# Altium schematic symbol library My Library.SchLib: 1211 symbols (part 8 of 12)

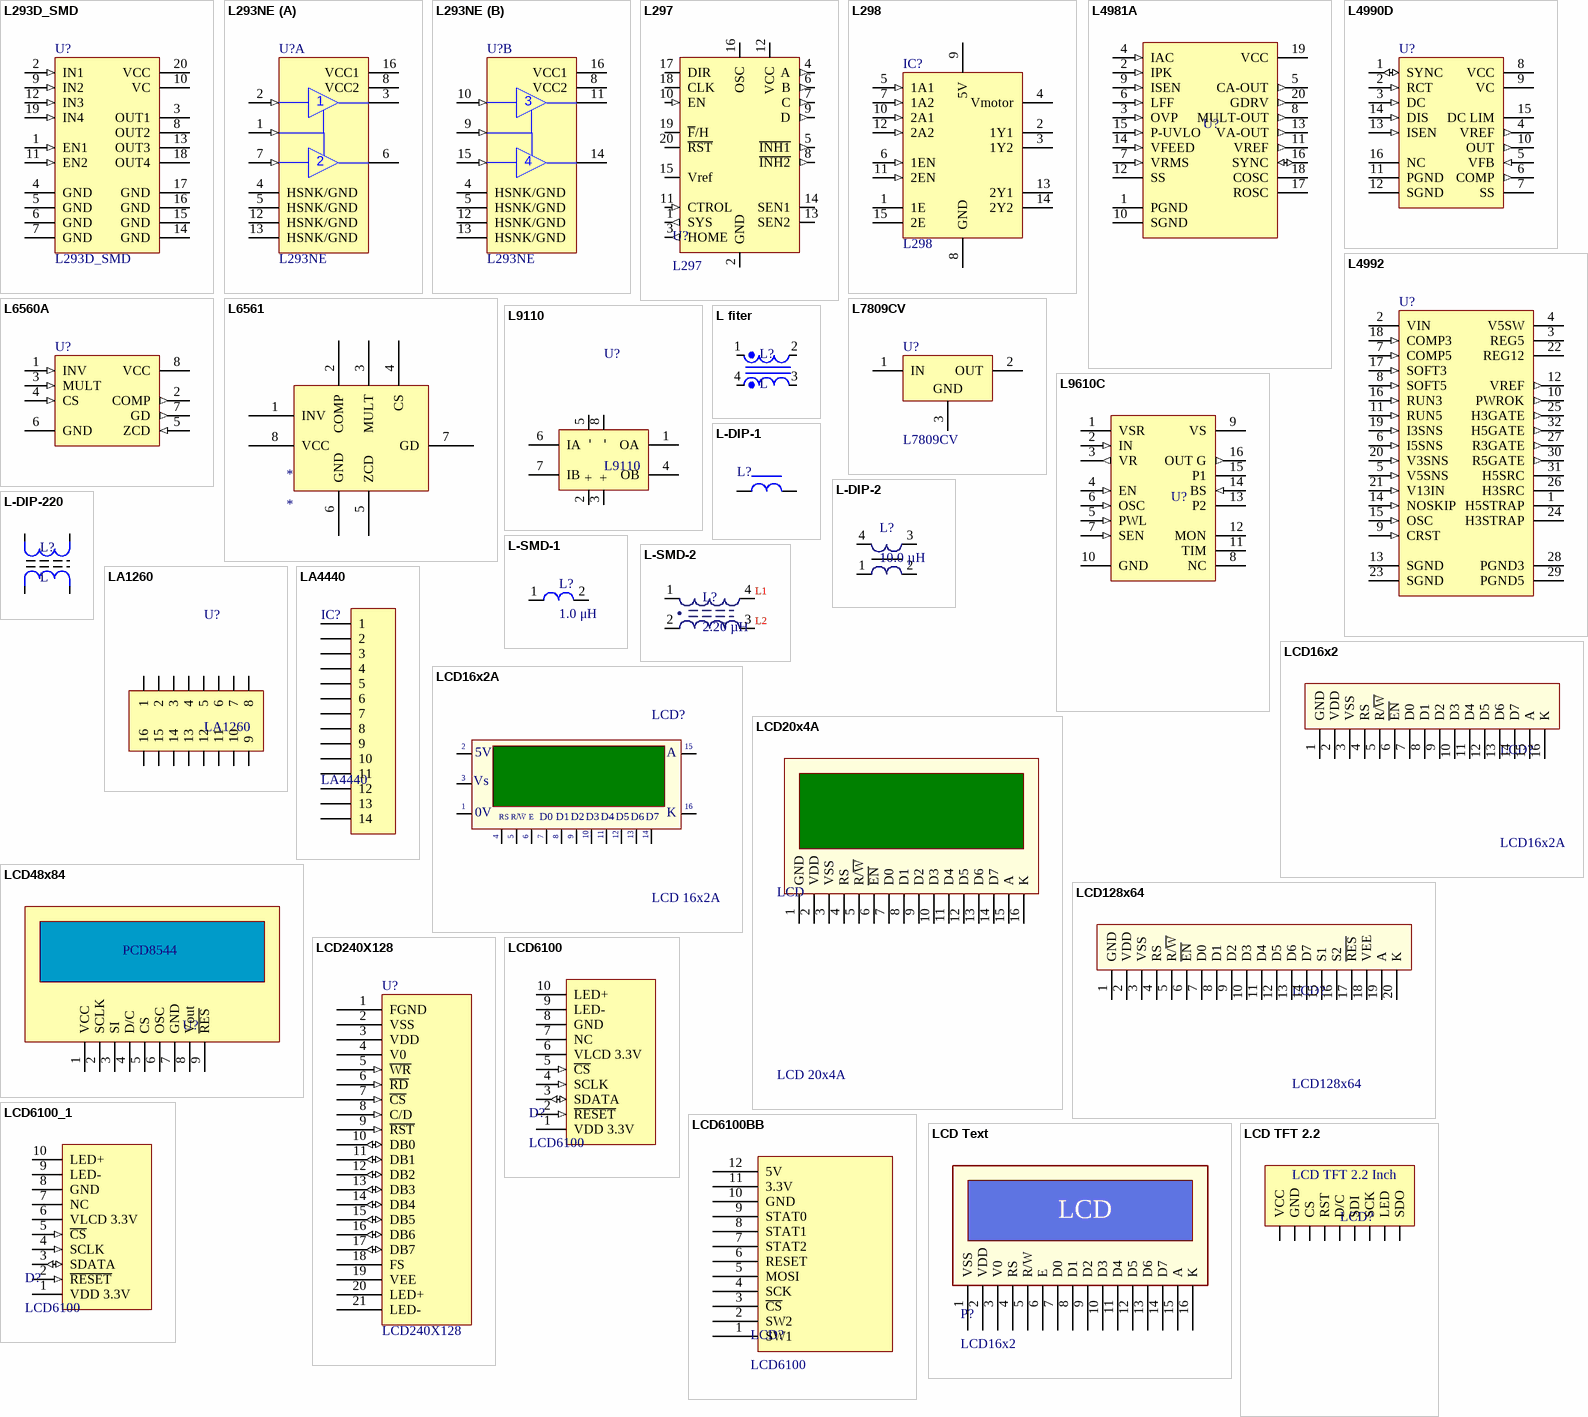
[diagram p48: symbols L293D_SMD to LCD TFT 2.2]

## L293D_SMD
designator U?
Push-Pull Four Channel Driver With Diode; Published: 8-Jun-2000; LatestRevisionDate: 06-Jun-2005; LatestRevisionNote: Stylized 3D Model Added.; DatasheetVersion: Jun-1996; PackageVersion: Apr-1996; PackageReference: DIP16; Publisher: Altium Limited; PackageDescription: DIP; 16 Leads; Row Spacing 7.62 mm; Pitch 2.54 mm; ComponentLink1Description: Manufacturer Link; ComponentLink1URL: http://www.st.com/; ComponentLink2Description: Datasheet; ComponentLink2URL: http://www.st.com/stonline/products/literature/ds/1330/l293d.pdf
footprint SO20 (SOIC, 20-Leads, Body 12.60x7.50mm, Pitch 1.27mm, IPC Medium Density)
pins: 1 EN1 (in), 2 IN1 (in), 3 OUT1 (hiz), 4 GND (power), 5 GND (power), 6 GND (power), 7 GND (power), 8 OUT2 (hiz), 9 IN2 (in), 10 VC (power), 11 EN2 (in), 12 IN3 (in), 13 OUT3 (hiz), 14 GND (power), 15 GND (power), 16 GND (power), 17 GND (power), 18 OUT4 (hiz), 19 IN4 (in), 20 VCC (power)

## L293NE
designator U?
Quadruple Half-H Driver; Published: 15-May-2002; LatestRevisionDate: 04-Mar-2005; LatestRevisionNote: Stylized 3D Model Added.; DatasheetVersion: May-1990; PackageVersion: 1991; PackageReference: NE016; Publisher: Altium Limited; PackageDescription: DIP; 16 Leads; Row Spacing 7.62 mm; Pitch 2.54 mm; Code_JEDEC: MS-001-BB; ComponentLink1Description: Manufacturer Link; ComponentLink1URL: http://www.ti.com/; ComponentLink2Description: Datasheet; ComponentLink2URL: http://www-s.ti.com/sc/ds/l293.pdf
footprint DIP16/W0.3 (16 PIN, W 300mil, Pin to pin 100mil)
pins on every part: 4 HSNK/GND (power), 5 HSNK/GND (power), 8 VCC2 (power), 12 HSNK/GND (power), 13 HSNK/GND (power), 16 VCC1 (power)
part A pins: 1 1,2EN (in), 2 1A (in), 3 1Y (hiz), 6 2Y (hiz), 7 2A (in)
part B pins: 9 3,4EN (in), 10 3A (in), 11 3Y (hiz), 14 4Y (hiz), 15 4A (in)

## L297
designator U?
Stepmotor control
footprint DIP20/W0.3 (DIP 20, 20 PIN, W 300mil, Pin to pin 100mil)
footprint SOP-20
pins: 1 SYS (out), 2 GND (power), 3 HOME (out), 4 A (out), 5 ~{INH1} (out), 6 B (out), 7 C (out), 8 ~{INH2} (out), 9 D (out), 10 EN (in), 11 CTROL (in), 12 VCC (power), 13 SEN2 (power), 14 SEN1 (power), 15 Vref (power), 16 OSC (power), 17 DIR (power), 18 CLK (power), 19 ~{F}/H (power), 20 ~{RST} (power)

## L298
designator IC?
Dual Full-H Driver; Note: The tab is elec is connected to GND pin; Published: 15-May-2002; DatasheetVersion: Jun-1990; PackageReference: KV015; Publisher: Altium Limited; PackageDescription: TO, Thru-Hole, Vertical, Heatsink Mounted; 15 Bent Staggered Leads; Pitch 1.27 mm; ComponentLink1Description: Manufacturer Link; ComponentLink1URL: http://www.ti.com/
footprint DIP15SL2 (TO, Thru-Hole, Vertical, Heatsink Mounted; 15 Bent Staggered Leads; Pitch 1.27 mm)
pins: 1 1E, 2 1Y1 (hiz), 3 1Y2 (hiz), 4 Vmotor (power), 5 1A1 (in), 6 1EN (in), 7 1A2 (in), 8 GND (power), 9 5V (power), 10 2A1 (in), 11 2EN (in), 12 2A2 (in), 13 2Y1 (hiz), 14 2Y2 (hiz), 15 2E

## L4981A
designator U?
Power Factor Corrector; Published: 24-Aug-2001; LatestRevisionDate: 06-Jun-2005; LatestRevisionNote: Stylized 3D Model Added.; DatasheetVersion: Sep-1998; PackageVersion: Jun-1998; PackageReference: DIP20; Publisher: Altium Limited; PackageDescription: DIP; 20 Leads; Row Spacing 7.62 mm; Pitch 2.54 mm; Code_JEDEC: MS-015-AE; ComponentLink1Description: Manufacturer Link; ComponentLink1URL: http://www.st.com/; ComponentLink2Description: Datasheet; ComponentLink2URL: http://www.st.com/stonline/products/literature/ds/1366/l4981.pdf
footprint DIP20 (DIP 20, 20 PIN, W 300mil, Pin to pin 100mil)
footprint SO20 (SOIC, 20-Leads, Body 12.60x7.50mm, Pitch 1.27mm, IPC Medium Density)
pins: 1 PGND (power), 2 IPK (in), 3 OVP (in), 4 IAC (in), 5 CA-OUT (out), 6 LFF (in), 7 VRMS (in), 8 MULT-OUT (out), 9 ISEN (in), 10 SGND (power), 11 VREF (out), 12 SS, 13 VA-OUT (out), 14 VFEED (in), 15 P-UVLO (in), 16 SYNC (io), 17 ROSC, 18 COSC, 19 VCC (power), 20 GDRV (out)

## L4990D
designator U?
Primary Controller; Published: 24-Aug-2001; LatestRevisionDate: 13-Apr-2006; LatestRevisionNote: IPC-7351 Footprint Added.; DatasheetVersion: Jul-1999; PackageVersion: Apr-1998; PackageReference: SO16W; Publisher: Altium Limited; PackageDescription: 16-Pin Small Outline Integrated Circuit 1.27 mm Pitch; Code_JEDEC: MS-013-AA; Code_IPC: SOIC127P1030-16; ComponentLink1Description: Manufacturer Link; ComponentLink1URL: http://www.st.com/
footprint DIP16
footprint SO16L (SOIC, 16-Leads, Body 10.30x7.50mm, Pitch 1.27mm, IPC Medium Density)
pins: 1 SYNC (io), 2 RCT (in), 3 DC (in), 4 VREF (out), 5 VFB (in), 6 COMP (out), 7 SS, 8 VCC (power), 9 VC (power), 10 OUT (out), 11 PGND (power), 12 SGND (power), 13 ISEN (in), 14 DIS (in), 15 DC LIM, 16 NC

## L4992
designator U?
Triple Output Power Supply Controller; Published: 24-Aug-2001; LatestRevisionDate: 13-Apr-2006; LatestRevisionNote: IPC-7351 Footprint Added.; DatasheetVersion: Mar-1998; PackageVersion: Oct-1997; PackageReference: TQFP32; Publisher: Altium Limited; PackageDescription: 32-Pin Thin Quad Flat Pack 0.8 mm Pitch; ComponentLink1Description: Manufacturer Link; ComponentLink1URL: http://www.st.com/
footprint TQFP32
pins: 1 H5STRAP, 2 VIN (power), 3 REG5 (power), 4 V5SW (power), 5 V5SNS (in), 6 I5SNS (in), 7 COMP5 (in), 8 SOFT5 (in), 9 CRST (in), 10 PWROK (out), 11 RUN5 (in), 12 VREF (out), 13 SGND (power), 14 NOSKIP (in), 15 OSC (in), 16 RUN3 (in), 17 SOFT3 (in), 18 COMP3 (in), 19 I3SNS (in), 20 V3SNS (in), 21 V13IN (in), 22 REG12 (power), 23 SGND (power), 24 H3STRAP, 25 H3GATE (out), 26 H3SRC, 27 R3GATE (out), 28 PGND3 (power), 29 PGND5 (power), 30 R5GATE (out), 31 H5SRC, 32 H5GATE (out)

## L6560A
designator U?
Power Factor Corrector; Published: 24-Aug-2001; LatestRevisionDate: 06-Jun-2005; LatestRevisionNote: Stylized 3D Model Added.; DatasheetVersion: Jul-1997; PackageReference: DIP8; Publisher: Altium Limited; PackageDescription: DIP; 8 Leads; Row Spacing 7.62 mm; Pitch 2.54 mm; Code_JEDEC: MO-001-AN; ComponentLink1Description: Manufacturer Link; ComponentLink1URL: http://www.st.com/
footprint DIP8
footprint SO8 (SOIC, 8-Leads, Body 4.9x3.9mm, Pitch 1.27mm, IPC High Density)
pins: 1 INV (in), 2 COMP (out), 3 MULT (in), 4 CS (in), 5 ZCD (in), 6 GND (power), 7 GD (out), 8 VCC (power)

## L6561
designator *
footprint DIP8
footprint SO8 (SOIC, 8-Leads, Body 4.9x3.9mm, Pitch 1.27mm, IPC High Density)
pins: 1 INV, 2 COMP, 3 MULT, 4 CS, 5 ZCD, 6 GND (power), 7 GD, 8 VCC (power)

## L7809CV
designator U?
Positive Voltage Regulator; Note: Tab is connected to pin 3 (GND).; Published: 24-Aug-2001; LatestRevisionDate: 17-Jul-2002; LatestRevisionNote: Re-released for DXP Platform.; DatasheetVersion: Dec-1998; PackageVersion: Jun-1998; PackageReference: TO220ABN; Publisher: Altium Limited; PackageDescription: TO, Thru-Hole, Vertical, Heatsink Mounted; 3 In-Line Leads; Pitch 2.54 mm; Pin sequence 1, 3, 2; ComponentLink1Description: Manufacturer Link; ComponentLink1URL: http://www.st.com/
footprint HDR1x3 BIG (3 chan cam 7805, BJT to, FET to...)
pins: 1 IN (power), 2 OUT (power), 3 GND (power)

## L9110
designator U?
Half-Bridge Driver
footprint DIP8
footprint SO8 (SOIC, 8-Leads, Body 4.9x3.9mm, Pitch 1.27mm, IPC High Density)
pins: 1 OA, 2 +, 3 +, 4 OB, 5 -, 6 IA, 7 IB, 8 -

## L9610C
designator U?
PWM Power MOS Controller; Published: 24-Aug-2001; LatestRevisionDate: 06-Jun-2005; LatestRevisionNote: Stylized 3D Model Added.; DatasheetVersion: Nov-1991; PackageVersion: Apr-1996; PackageReference: DIP16; Publisher: Altium Limited; PackageDescription: DIP; 16 Leads; Row Spacing 7.62 mm; Pitch 2.54 mm; ComponentLink1Description: Manufacturer Link; ComponentLink1URL: http://www.st.com/; ComponentLink2Description: Datasheet; ComponentLink2URL: http://www.st.com/stonline/products/literature/ds/1408/l9610.pdf
footprint DIP16
footprint SO16 (SOIC, 16-Leads, Body 9.90x3.91mm, Pitch 1.27mm, IPC Medium Density)
pins: 1 VSR, 2 IN (in), 3 VR (out), 4 EN (in), 5 PWL (in), 6 OSC (in), 7 SEN (in), 8 NC, 9 VS (power), 10 GND (power), 11 TIM, 12 MON (oc), 13 P2, 14 BS (in), 15 P1, 16 OUT G (out)

## L fiter
designator L?, comment L
Inductor; Value: Loc 220; Designed by: VanDungEvn
footprint L fiter (Fiter)
pins: 1, 2, 3, 4

## L-DIP-1
designator L?
Inductor; Value: 150 mH
footprint L-DIP-M-5.3 (THT Inductor, 2-Leads, Body 5.3  mm)
footprint L-DIP-M-6.0 (THT Inductor, 2-Leads, Body 6,0  mm)
footprint L-DIP-M-7.8 (THT Inductor, 2-Leads, Body 7,8  mm)
footprint L-DIP-M-8 (THT Inductor, 2-Leads, Body 8,0  mm)
footprint L-DIP-M-9.5x5.5 (Body 9.5x5.5mm, 2 leads)
footprint L-DIP-M-9.5x6 (Body 9.5x6mm, 2 leads)
footprint L-DIP-M-10 (THT Inductor, 2-Leads, Body 10,0  mm)
footprint L-DIP-M-10x5 (Body 10x5mm, 2 leads)
footprint L-DIP-M-10.5x5.5 (Body 10.5x5.5mm, 2 leads)
footprint L-DIP-M-11.5x5 (Body 11.5x5mm, 2 leads)
footprint L-DIP-M-12x5 (Body 12x5.5mm, 2 leads)
footprint L-DIP-M-12x5.5 (Body 12x5.5mm, 2 leads)
footprint L-DIP-M-12x6 (Body 12x6mm, 2 leads)
footprint L-DIP-M-13.5x6 (Body 13.5x6mm, 2 leads)
footprint L-DIP-M-13.5x6.5 (Body 13.5x6.5mm, 2 leads)
footprint L-DIP-M-13.5x7 (Body 13.5x7mm, 2 leads)
footprint L-DIP-M-14x7 (Body 14x7mm, 2 leads)
footprint L-DIP-M-16x9 (Body 16x9mm, 2 leads)
footprint L-DIP-M-15x7 (Body 15x7mm, 2 leads)
footprint L-DIP-M-15.5x8 (Body 15.5x8mm, 2 leads)
footprint L-DIP-M-16x8.5 (Body 16x8.5mm, 2 leads)
footprint L-DIP-M-16.5x8.5 (Body 16.5x8.5mm, 2 leads)
footprint L-DIP-M-17.5x8.5 (Body 17.5x8.5mm, 2 leads)
footprint L-DIP-M-17.5x9 (Body 17.5x9mm, 2 leads)
footprint L-DIP-M-17.5x13 (Body 17.5x13mm, 2 leads)
footprint L-DIP-M-18x9 (Body 18x9mm, 2 leads)
footprint L-DIP-M-18.5x8 (Body 17.5x8mm, 2 leads)
footprint L-DIP-M-18.5x8.5 (Body 18.5x8.5mm, 2 leads)
footprint L-DIP-M-18.5x9 (Body 18.5x9.5mm, 2 leads)
footprint L-DIP-M-18.5X9.5 (Body 18.5x9.5mm, 2 leads)
footprint L-DIP-M-19x10.5 (Body 19x10.5mm, 2 leads)
footprint L-DIP-M-25x12 (Body 25x12mm, 2 leads)
footprint L-DIP-M-21x11 (Body 21x11mm, 2 leads)
footprint L-DIP-M-25x11 (Body 25x11mm, 2 leads)
footprint L-DIP-M-26x12 (Body 26x12mm, 2 leads)
footprint L-DIP-M-25x13 (Body 25x13mm, 2 leads)
footprint L-DIP-M-27.5x13 (Body 27.5x13mm, 2 leads)
footprint L-DIP-M-28.5x15 (Body 28.5x15mm, 2 leads)
footprint L-DIP-M-31x13
footprint L-DIP-M-38x17 (Body 38x17mm, 2 leads)
footprint RES-1/2W
footprint RES-1/8W-SMALL (R 1/8W, 2 pin, 200mil)
footprint RES-1W
footprint RES-2W (R2W, 2 pin, 700mil)
pins: 1, 2

## L-DIP-2
designator L?, comment 10.0 µH
partNo: 744284100; Manufacturer: Würth Elektronik eiSos GmbH; Inductance: 10.0 µH; ComponentLink1Description: Manufacturer; ComponentLink1URL: http://www.we-online.de; Created by: Christin Zierenner; Created Date: March 2012; ComponentLink2Description: Datasheet; ComponentLink2URL: http://www.we-online.de/katalog/media/pdf/744284100.pdf
footprint L-DIP-D-14x7.5 (THT-4pin- Body 14x7.5mm)
footprint L-DIP-D-15x7.5 (THT Inductor, 2-Leads, Body 15,0x7,5mm)
footprint L-DIP-D-17.5x13 (THT Inductor, 4-Leads, Body 17,5x13,0mm)
footprint L-DIP-D-25x17 (THT Inductor, 4-Leads, Body 25,0x17,0mm)
footprint L-DIP-D-27.5x18.5 (THT Inductor, 4-Leads, Body 27,5x18,5mm)
footprint L-DIP-D-30x19 (THT-4pin- Body 30x19mm)
footprint L-DIP-D-33x19 (THT-4pin- Body 33mmx19mm)
footprint L-DIP-D-36x23 (THT-4pin- Body 36mmx23mm)
footprint L-DIP-D-46x27 (THT-4pin- Body 46mmx27mm)
footprint L-DIP-D-47x27 (THT-4pin- Body 47mmx27mm)
pins: 1, 2, 3, 4

## L-DIP-220
designator L?, comment L
Inductor; Value: Loc 220; Designed by: VanDungEvn
footprint L-DIP-220 (Loc 220)
pins: 1, 2, 3, 4

## L-SMD-1
designator L?, comment 1.0 μH
partNo: 78477010; Manufacturer: Wurth Elektronik; Inductance: 1.0 μH; ComponentLink1Description: Manufacturer; ComponentLink1URL: http://www.we-online.de; Created by: Baojun Chen; Created Date: Nov.2015; ComponentLink2Description: Datasheet; ComponentLink2URL: http://katalog.we-online.de/pbs/datasheet/78477010.pdf
footprint L-SMD-M-7.3x4.5 (WE-PDA SMD Shielded Power Inductor, 7345)
footprint L-SMD-M-12x10 (WE-PDA SMD Shielded Power Inductor, 1210)
pins: 1, 2

## L-SMD-2
designator L?, comment 2.20 µH
partNo: 7448709022; Manufacturer: Würth Elektronik eiSos GmbH; Inductance: 2.20 µH; ComponentLink1Description: Manufacturer; ComponentLink1URL: http://www.we-online.de; Created by: Christin Otto; Created Date: August 2013; ComponentLink2Description: Datasheet; ComponentLink2URL: http://katalog.we-online.de/pbs/datasheet/7448709022.pdf
footprint L-SMD-D-7.3x7.3 (SMD Inductor,  4-Leads, Body 7.3x7.3mm (max))
footprint L-SMD-D-12.5x12.5 (SMD Inductor, 4-Leads, Body 12.5x12.5mm (max))
pins: 1, 2, 3, 4
text: L1; L2

## LA1260
designator U?
footprint DIP16
pins: 1, 2, 3, 4, 5, 6, 7, 8, 9, 10, 11, 12, 13, 14, 15, 16

## LA4440
designator IC?
Manufacturer: W¨¹rth Elektronik eiSos GmbH; partNo: 613014143121; ComponentLink1 Description: Manufacturer; ComponentLink2 Description: Datasheet; NoPins: 14; Created Date: 29 March 2013; ComponentLink1URL: http://www.we-online.com; ComponentLink2URL: http://katalog.we-online.de/em/datasheet/6130xx143121.pdf; Created by: Karrer Zheng
footprint JP14-C1T (14 row, straight, gold plating)
footprint LA4440
pins: 1, 2, 3, 4, 5, 6, 7, 8, 9, 10, 11, 12, 13, 14

## LCD16x2
designator LCD?, comment LCD16x2A
LCD dipslay 16 char, 2 line; Value: LCD16x2A
footprint LCD16X2N (LCD dipslay 16x2, 16 pin)
footprint LCD16X2 (LCD dipslay 16x2, 16 pin)
pins: 1 GND, 2 VDD, 3 VSS, 4 RS, 5 R/~{W}, 6 ~{EN}, 7 D0, 8 D1, 9 D2, 10 D3, 11 D4, 12 D5, 13 D6, 14 D7, 15 A, 16 K

## LCD16x2A
designator LCD?, comment LCD 16x2A
LCD dipslay 16 char, 2 line; Value: LCD16x2A
footprint LCD16X2 (LCD dipslay 16x2, 16 pin)
footprint LCD16X2N (LCD dipslay 16x2, 16 pin)
pins: 1 GND, 2 VDD, 3 VEE, 4 RS, 5 R/~{W}, 6 ~{EN}, 7 D0, 8 D1, 9 D2, 10 D3, 11 D4, 12 D5, 13 D6, 14 D7, 15 A, 16 K
text: 5V; Vs; |; 0V; R/W; E

## LCD20x4A
designator LCD, comment LCD 20x4A
LCD dipslay 20 char, 4 line; Value: Jum 40; Value: LCD 20x4A
footprint LCD20X4A (LCD dipslay 20x4, 16 pin)
pins: 1 GND, 2 VDD, 3 VSS, 4 RS, 5 R/~{W}, 6 ~{EN}, 7 D0, 8 D1, 9 D2, 10 D3, 11 D4, 12 D5, 13 D6, 14 D7, 15 A, 16 K

## LCD48x84
designator U?, comment PCD8544
LCD Graphic; Value: PCD8544
footprint CON9
pins: 1 VCC, 2 SCLK, 3 SI, 4 D/C, 5 CS, 6 OSC, 7 GND, 8 Vout, 9 ~{RES}

## LCD128x64
designator LCD?
LCD Graphic 128x64; Value: LCD 128x64
footprint LCD128x64 (LCD Graphic 128x64, 20 pin)
pins: 1 GND, 2 VDD, 3 VSS, 4 RS, 5 R/~{W}, 6 ~{EN}, 7 D0, 8 D1, 9 D2, 10 D3, 11 D4, 12 D5, 13 D6, 14 D7, 15 S1, 16 S2, 17 ~{RES}, 18 VEE, 19 A, 20 K

## LCD240X128
designator U?
Mµn h×nh LCD 240x128
footprint LCD
pins: 1 FGND, 2 VSS, 3 VDD, 4 V0, 5 ~{WR} (in), 6 ~{RD} (in), 7 ~{CS} (in), 8 C/D (in), 9 ~{RST} (in), 10 DB0 (io), 11 DB1 (io), 12 DB2 (io), 13 DB3 (io), 14 DB4 (io), 15 DB5 (io), 16 DB6 (io), 17 DB7 (io), 18 FS, 19 VEE, 20 LED+, 21 LED-

## LCD6100
designator D?
GLCD 132 pixel x 132 pixel - 4096 color
pins: 1 VDD 3.3V (power), 2 ~{RESET} (in), 3 SDATA (io), 4 SCLK (in), 5 ~{CS} (in), 6 VLCD 3.3V (power), 7 NC, 8 GND (power), 9 LED- (power), 10 LED+ (power)

## LCD6100_1
designator D?, comment LCD6100
GLCD 132 pixel x 132 pixel - 4096 color
pins: 1 VDD 3.3V (power), 2 ~{RESET} (in), 3 SDATA (io), 4 SCLK (in), 5 ~{CS} (in), 6 VLCD 3.3V (power), 7 NC, 8 GND (power), 9 LED- (power), 10 LED+ (power)

## LCD6100BB
designator LCD?, comment LCD6100
footprint HDR1X12 (Connector; Header; 12 Position)
pins: 1 SW1, 2 SW2, 3 ~{CS}, 4 SCK, 5 MOSI, 6 RESET, 7 STAT2, 8 STAT1, 9 STAT0, 10 GND, 11 3.3V, 12 5V

## LCD Text
designator P?, comment LCD16x2
footprint LCD16X2 (LCD 16x2)
footprint HDR1X16 (Connector; Header; 16 Position)
pins: 1 VSS, 2 VDD, 3 V0, 4 RS, 5 R/W, 6 E, 7 D0, 8 D1, 9 D2, 10 D3, 11 D4, 12 D5, 13 D6, 14 D7, 15 A, 16 K
text: LCD

## LCD TFT 2.2
designator LCD?
Manufacturer: W¨¹rth Elektronik eiSos GmbH; partNo: 613009143121; ComponentLink1 Description: Manufacturer; ComponentLink2 Description: Datasheet; NoPins: 09; Created Date: 29 March 2013; ComponentLink1URL: http://www.we-online.com; ComponentLink2URL: http://katalog.we-online.de/em/datasheet/6130xx143121.pdf; Created by: Karrer Zheng
footprint LCD TFT 2.2
footprint JP9-C1T (9 row, straight, gold plating)
pins: 1 VCC, 2 GND, 3 CS, 4 RST, 5 D/C, 6 SDI, 7 SCK, 8 LED, 9 SDO
text: LCD TFT 2.2 Inch

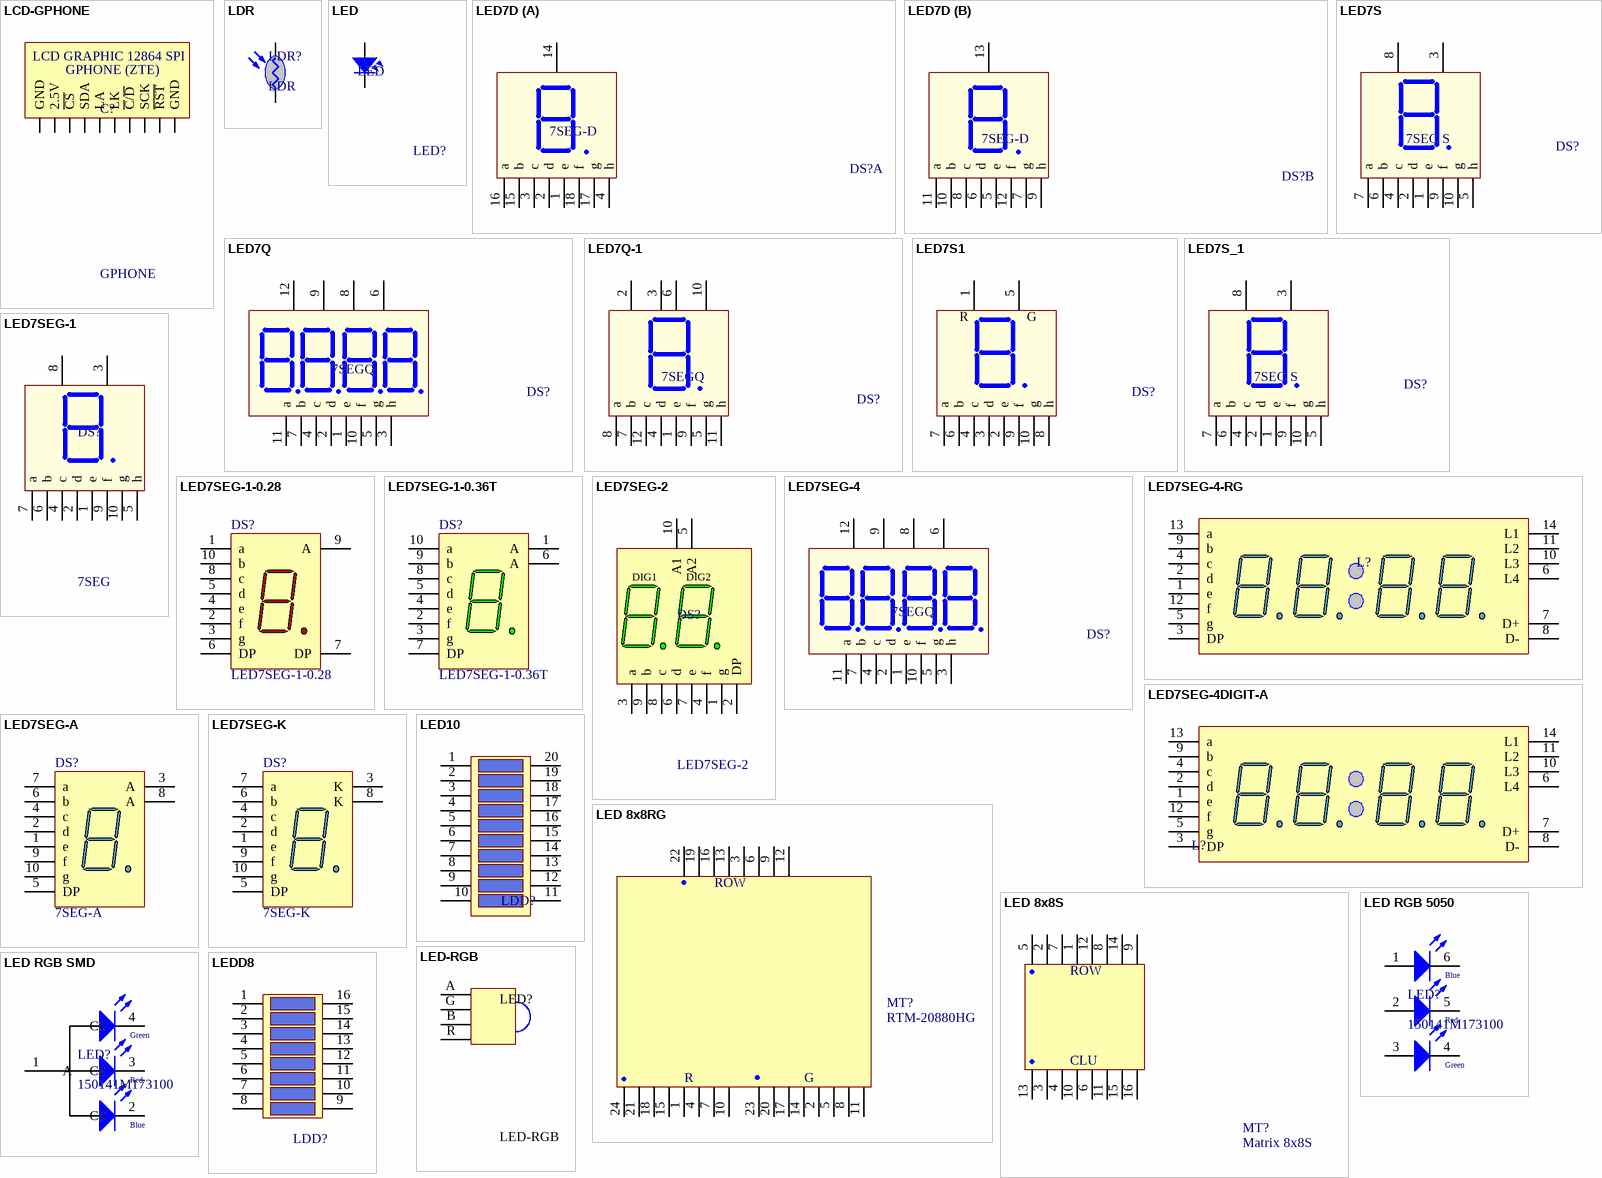
[diagram p49: symbols LCD-GPHONE to LEDD8]

## LCD-GPHONE
designator C?, comment GPHONE
Manufacturer: W¨¹rth Elektronik eiSos GmbH; partNo: 613010143121; ComponentLink1 Description: Manufacturer; ComponentLink2 Description: Datasheet; NoPins: 10; Created Date: 29 March 2013; ComponentLink1URL: http://www.we-online.com; ComponentLink2URL: http://katalog.we-online.de/em/datasheet/6130xx143121.pdf; Created by: Karrer Zheng
footprint LCD-GPHONE (10p, 1 row, straight, gold plating)
pins: 1 GND, 2 2.5V, 3 ~{CS}, 4 SDA, 5 LA, 6 LK, 7 ~{C}/~{D}, 8 SCK, 9 ~{RST}, 10 GND
text: LCD GRAPHIC 12864 SPI; GPHONE (ZTE)

## LDR
designator LDR?
Quang Tro
footprint CDS (Footprint not found)
pins: 1 A, 2 K

## LED
designator LED?
LED Single colour Green and Red; Value: LED 3 ly Single Colour
footprint LED-3 (LED 2 PIN, 3ly Only colour)
footprint LED-5 GRe (LED 2 PIN, 5 ly , Only colour,pin to pin 100mil)
footprint LED-5TRED (LED 2 PIN, 5 ly , Only colour, pin to pin 110mil)
footprint LED-0805-Blue
footprint LED-0805-Green
footprint LED-0805-Orange
footprint LED-0805-Red
footprint LED-0805-Yellow
footprint LED-1206-Blue (Compoment SMD 120x60mil)
footprint LED-1206-Green
footprint LED-1206-Orange
footprint LED-1206-Red
footprint LED-1206-Yellow
pins: 1, 2

## LED7D
designator DS?, comment 7SEG-D
Two 7 Seg Dipslay; Value: LED 7D SEG
footprint 7SEGD (DIP 18Leads; Body 24 x 15 mm; Pitch 0.5 mm)
part A pins: 1 e, 2 d, 3 c, 4 h, 14 V1, 15 b, 16 a, 17 g, 18 f
part B pins: 5 e, 6 d, 7 g, 8 c, 9 h, 10 b, 11 a, 12 f, 13 V2

## LED7Q
designator DS?, comment 7SEGQ
Four 7 Seg Dipslay; Value: LED 7Q SEG
footprint 7SEGQ (DIP 12 Leads; Body 48 x 20 mm; Pitch 0.5 mm)
pins: 1 e, 2 d, 3 h, 4 c, 5 g, 6 V4, 7 b, 8 V3, 9 V2, 10 f, 11 a, 12 V1

## LED7Q-1
designator DS?, comment 7SEGQ
Four 7 Seg Dipslay; Value: LED 7Q SEG
footprint 7SEGQ (DIP 12 Leads; Body 48 x 20 mm; Pitch 0.5 mm)
pins: 1 e, 2 V1, 3 V2, 4 d, 5 g, 6 V3, 7 b, 8 a, 9 f, 10 V4, 11 h, 12 c

## LED7S
designator DS?, comment 7SEG S
Single 7 Seg Dipslay; Value: LED 7S SEG
footprint 7SEGS (DIP 10 Leads; Body 12 x 15 mm; Pitch 0.5 mm)
pins: 1 e, 2 d, 3 Vcc, 4 c, 5 h, 6 b, 7 a, 8 Vcc, 9 f, 10 g

## LED7S1
designator DS?, comment 7SEG S  (value not drawn)
Single 7 Seg Dipslay 29x41 mm; Value: LED 7S SEG
footprint 7SEG_29x41 (DIP 10 Leads; Body 29 x 41 mm; Pitch 0.5 mm)
footprint 7SEG_37x55 (DIP 10 Leads; Body 29 x 41 mm; Pitch 0.5 mm)
pins: 1 R, 2 e, 3 d, 4 c, 5 COM, 6 b, 7 a, 8 h, 9 f, 10 g
text: G

## LED7S_1
designator DS?, comment 7SEG S
Single 7 Seg Dipslay; Value: LED 7S SEG
footprint 7SEGS (DIP 10 Leads; Body 12 x 15 mm; Pitch 0.5 mm)
pins: 1 e, 2 d, 3 Vcc, 4 c, 5 h, 6 b, 7 a, 8 Vcc, 9 f, 10 g

## LED7SEG-1
designator DS?, comment 7SEG
14.2 mm General Purpose Blue 7-Segment Display: CC, RH DP, Gray Surface; MinimumIntensity: 2020 ucd; Note: IF = 10 mA; Published: 8-Jun-2000; LatestRevisionDate: 17-Dec-2003; LatestRevisionNote: Schematic revised, PCB Footprint replaced.; DatasheetDocument: 24-Sep-2002; PackageDocument: 24-Sep-2002; PackageReference: H; Publisher: Altium Limited; Colour: Blue; ComponentLink1Description: Manufacturer Link; ComponentLink1URL: http://www.agilent.com/
footprint LED7SEG-1-0.56
footprint LED7SEG-1-1.5
pins: 1 e, 2 d, 3 Vcc, 4 c, 5 h, 6 b, 7 a, 8 Vcc, 9 f, 10 g

## LED7SEG-1-0.28
designator DS?
8 mm Black Surface Ultra Mini AlGaAs Red 7-Segment Display: CA, RH DP; Published: 26-May-2004; LatestRevisionDate: 11-Oct-2004; LatestRevisionNote: Display outline superimposed on PCB Footprint.; DatasheetVersion: 26-Jul-2001; PackageVersion: 26-Jul-2001; PackageReference: U; Publisher: Altium Limited; PackageDescription: LED, 7-Segment Display, 8 mm, RHD; 10 Leads; Row Space 5.31 mm; Pitch 2.01 mm; ComponentLink1Description: Manufacturer Link; ComponentLink1URL: http://www.avagotech.com/; ComponentLink2Description: Datasheet; ComponentLink2URL: http://cp.literature.agilent.com/litweb/pdf/5988-2220EN.pdf
footprint LED7SEG-1-0.28
pins: 1 a "Cathode", 2 f "Cathode", 3 g "Cathode", 4 e "Cathode", 5 d "Cathode", 6 DP "Cathode", 7 DP "Anode", 8 c "Cathode", 9 A "Anode", 10 b "Cathode"

## LED7SEG-1-0.36T
designator DS?
7.6 mm Micro Bright Green 7-Segment Display: CA, RH DP; Note: Pins 1 and 6 are redundant Anodes.; Published: 26-May-2004; LatestRevisionDate: 11-Oct-2004; LatestRevisionNote: Display outline superimposed on PCB Footprint.; DatasheetVersion: 11-Feb-2002; PackageVersion: 11-Feb-2002; PackageReference: A; Publisher: Altium Limited; PackageDescription: LED, 7-Segment Display, 7.62 mm, RHD; 10 Leads; Row Space 5.08 mm; Pitch 2.54 mm; ComponentLink1Description: Manufacturer Link; ComponentLink1URL: http://www.avagotech.com/; ComponentLink2Description: Datasheet; ComponentLink2URL: http://cp.literature.agilent.com/litweb/pdf/5988-4434EN.pdf
footprint LED7SEG-1-0.36T
pins: 1 A "Anode", 2 f "Cathode", 3 g "Cathode", 4 e "Cathode", 5 d "Cathode", 6 A "Anode", 7 DP "Cathode", 8 c "Cathode", 9 b "Cathode", 10 a "Cathode"

## LED7SEG-2
designator DS?
9.2 mm Green 7-Segment Display: 2-Digit, RH DP; Published: 26-May-2004; LatestRevisionDate: 11-Oct-2004; LatestRevisionNote: Display outline superimposed on PCB Footprint.; DatasheetVersion: 14-Mar-2003; PackageVersion: 14-Mar-2003; PackageReference: HDSM-577; Publisher: Altium Limited; PackageDescription: LED, 7-Segment Display, 9.2 mm, Dual Digit; 10 Leads; Row Space 10.7 mm; Pitch 2.54 mm; ComponentLink1Description: Manufacturer Link; ComponentLink1URL: http://www.avagotech.com/
footprint LED7SEG-2-0.36 (LED, 7-Segment Display, 9.2 mm, Dual Digit; 10 Leads; Row Space 10.7 mm; Pitch 2.54 mm)
pins: 1 g "Digits (1&2) Cathode", 2 DP "Digits (1&2) Cathode", 3 a "Digits (1&2) Cathode", 4 f "Digits (1&2) Cathode", 5 A2 "Common Anode", 6 d "Digits (1&2) Cathode", 7 e "Digits (1&2) Cathode", 8 c "Digits (1&2) Cathode", 9 b "Digits (1&2) Cathode", 10 A1 "Common Anode"
text: DIG1; DIG2

## LED7SEG-4
designator DS?, comment 7SEGQ
Four 7 Seg Dipslay; Value: LED 7Q SEG
footprint LED7SEG-4-0.56 (DIP 12 Leads; Body 48 x 20 mm; Pitch 0.5 mm)
footprint LED7SEG-4-0.36 (DIP 12 Leads; Body 32x 15 mm; Pitch 0.5 mm)
pins: 1 e, 2 d, 3 h, 4 c, 5 g, 6 V4, 7 b, 8 V3, 9 V2, 10 f, 11 a, 12 V1

## LED7SEG-4-RG
designator L?, comment Led 7 Seg 4 digit - Anode  (value not drawn)
footprint LED7SEG-4-0.56-RG
pins: 1 e "Cathode", 2 d "Cathode", 3 DP "Cathode", 4 c "Cathode", 5 g "Cathode", 6 L4 "Common Anode", 7 D+ "Common Anode", 8 D- "Common Anode", 9 b "Cathode", 10 L3 "Common Anode", 11 L2 "Common Anode", 12 f "Cathode", 13 a "Cathode", 14 L1 "Common Anode"

## LED7SEG-4DIGIT-A
designator L?, comment Led 7 Seg 4 digit - Anode  (value not drawn)
footprint LED7SED-4-A
pins: 1 e "Cathode", 2 d "Cathode", 3 DP "Cathode", 4 c "Cathode", 5 g "Cathode", 6 L4 "Common Anode", 7 D+ "Common Anode", 8 D- "Common Anode", 9 b "Cathode", 10 L3 "Common Anode", 11 L2 "Common Anode", 12 f "Cathode", 13 a "Cathode", 14 L1 "Common Anode"

## LED7SEG-A
designator DS?, comment 7SEG-A
14.2 mm General Purpose Blue 7-Segment Display: CA, RH DP, Gray Surface; MinimumIntensity: 2020 ucd; Note: IF = 10 mA; Published: 8-Jun-2000; LatestRevisionDate: 17-Dec-2003; LatestRevisionNote: Schematic revised, PCB Footprint replaced.; DatasheetDocument: 24-Sep-2002; PackageDocument: 24-Sep-2002; PackageReference: H; Publisher: Altium Limited; Colour: Blue; ComponentLink1Description: Manufacturer Link; ComponentLink1URL: http://www.agilent.com/
footprint LED7SEG
pins: 1 e "Cathode", 2 d "Cathode", 3 A "Common Anode", 4 c "Cathode", 5 DP "Cathode", 6 b "Cathode", 7 a "Cathode", 8 A "Common Anode", 9 f "Cathode", 10 g "Cathode"

## LED7SEG-K
designator DS?, comment 7SEG-K
14.2 mm General Purpose Blue 7-Segment Display: CC, RH DP, Gray Surface; MinimumIntensity: 2020 ucd; Note: IF = 10 mA; Published: 8-Jun-2000; LatestRevisionDate: 17-Dec-2003; LatestRevisionNote: Schematic revised, PCB Footprint replaced.; DatasheetDocument: 24-Sep-2002; PackageDocument: 24-Sep-2002; PackageReference: H; Publisher: Altium Limited; Colour: Blue; ComponentLink1Description: Manufacturer Link; ComponentLink1URL: http://www.agilent.com/
footprint LED7SEG
pins: 1 e "Anode", 2 d "Anode", 3 K "Common Cathode", 4 c "Anode", 5 DP "Anode", 6 b "Anode", 7 a "Anode", 8 K "Common Cathode", 9 f "Anode", 10 g "Anode"

## LED10
designator LDD?, comment LED DIP 8  (value not drawn)
LED10; Value: LED DIP 8
footprint LEDBAR-10-RED
pins: 1, 2, 3, 4, 5, 6, 7, 8, 9, 10, 11, 12, 13, 14, 15, 16, 17, 18, 19, 20

## LED 8x8RG
designator MT?, comment RTM-20880HG
Matrix 8x8, Two colour; Value: Matrix 8x8 two colour
footprint 8x8RG (Matran 8x8 2mau,Body 60 X 60mm)
pins: 1 R5, 2 G5, 3 H5, 4 R6, 5 G6, 6 H6, 7 R7, 8 G7, 9 H7, 10 R8, 11 G8, 12 H8, 13 H4, 14 G4, 15 R4, 16 H3, 17 G3, 18 R3, 19 H2, 20 G2, 21 R2, 22 H1, 23 G1, 24 R1
text: ROW; R; G

## LED 8x8S
designator MT?, comment Matrix 8x8S
Matrix 8x8,  Single colour; Value: Matrix 8x8S
footprint 8x8S (Matran 8x8, Body 60 X 60mm)
pins: 1 H4, 2 H2, 3 C2, 4 C3, 5 H1, 6 C5, 7 H3, 8 H6, 9 H8, 10 C4, 11 C6, 12 H5, 13 C1, 14 H7, 15 C7, 16 C8
text: ROW; CLU

## LED RGB 5050
designator LED?, comment 150141M173100
Manufacturer: Würth Elektronik eiSos GmbH; Color: Red & Green & Blue; PartNo: 150141M173100; ComponentLink1Description: Manufacturer; ComponentLink1URL: http://www.we-online.de; Created by: Christin Otto; Created Date: June 2013; ComponentLink2Description: Datasheet; ComponentLink2URL: http://katalog.we-online.com/led/datasheet/150141M173100.pdf
footprint LED RGB 5050
pins: 1, 2, 3, 4, 5, 6
1 alternate drawing of the same symbol
text: Blue; Red; Green

## LED RGB SMD
designator LED?, comment 150141M173100
SMD Full-Color Top LED, WL-SFTW, Red & Green & Blue; Manufacturer: Würth Elektronik eiSos GmbH; PartNo: 150141M173100; ComponentLink1Description: Manufacturer; ComponentLink1URL: http://www.we-online.de; Created by: Christin Otto; Created Date: June 2013; ComponentLink2Description: Datasheet; ComponentLink2URL: http://katalog.we-online.com/led/datasheet/150141M173100.pdf; Color: Red & Green & Blue
footprint LED RGB 3528 (Chip LED, 4-Leads, Body 2.8x3.5mm (max), Pitch 1.42mm, IPC Medium Density)
pins: 1 A, 2 C3, 3 C2, 4 C1
1 alternate drawing of the same symbol
text: Green; Red; Blue

## LED-RGB
designator LED?
footprint LED-5MMRGBCA
footprint LED RGB-5MM-RA (LED RGB Right Angle 5mm)
pins: A, B, G, R

## LEDD8
designator LDD?, comment LED DIP 8  (value not drawn)
Value: LED DIP 8
footprint DIP16/W0.3K (16 PIN, W 300mil, Pin to pin 100mil For Switch)
pins: 1, 2, 3, 4, 5, 6, 7, 8, 9, 10, 11, 12, 13, 14, 15, 16

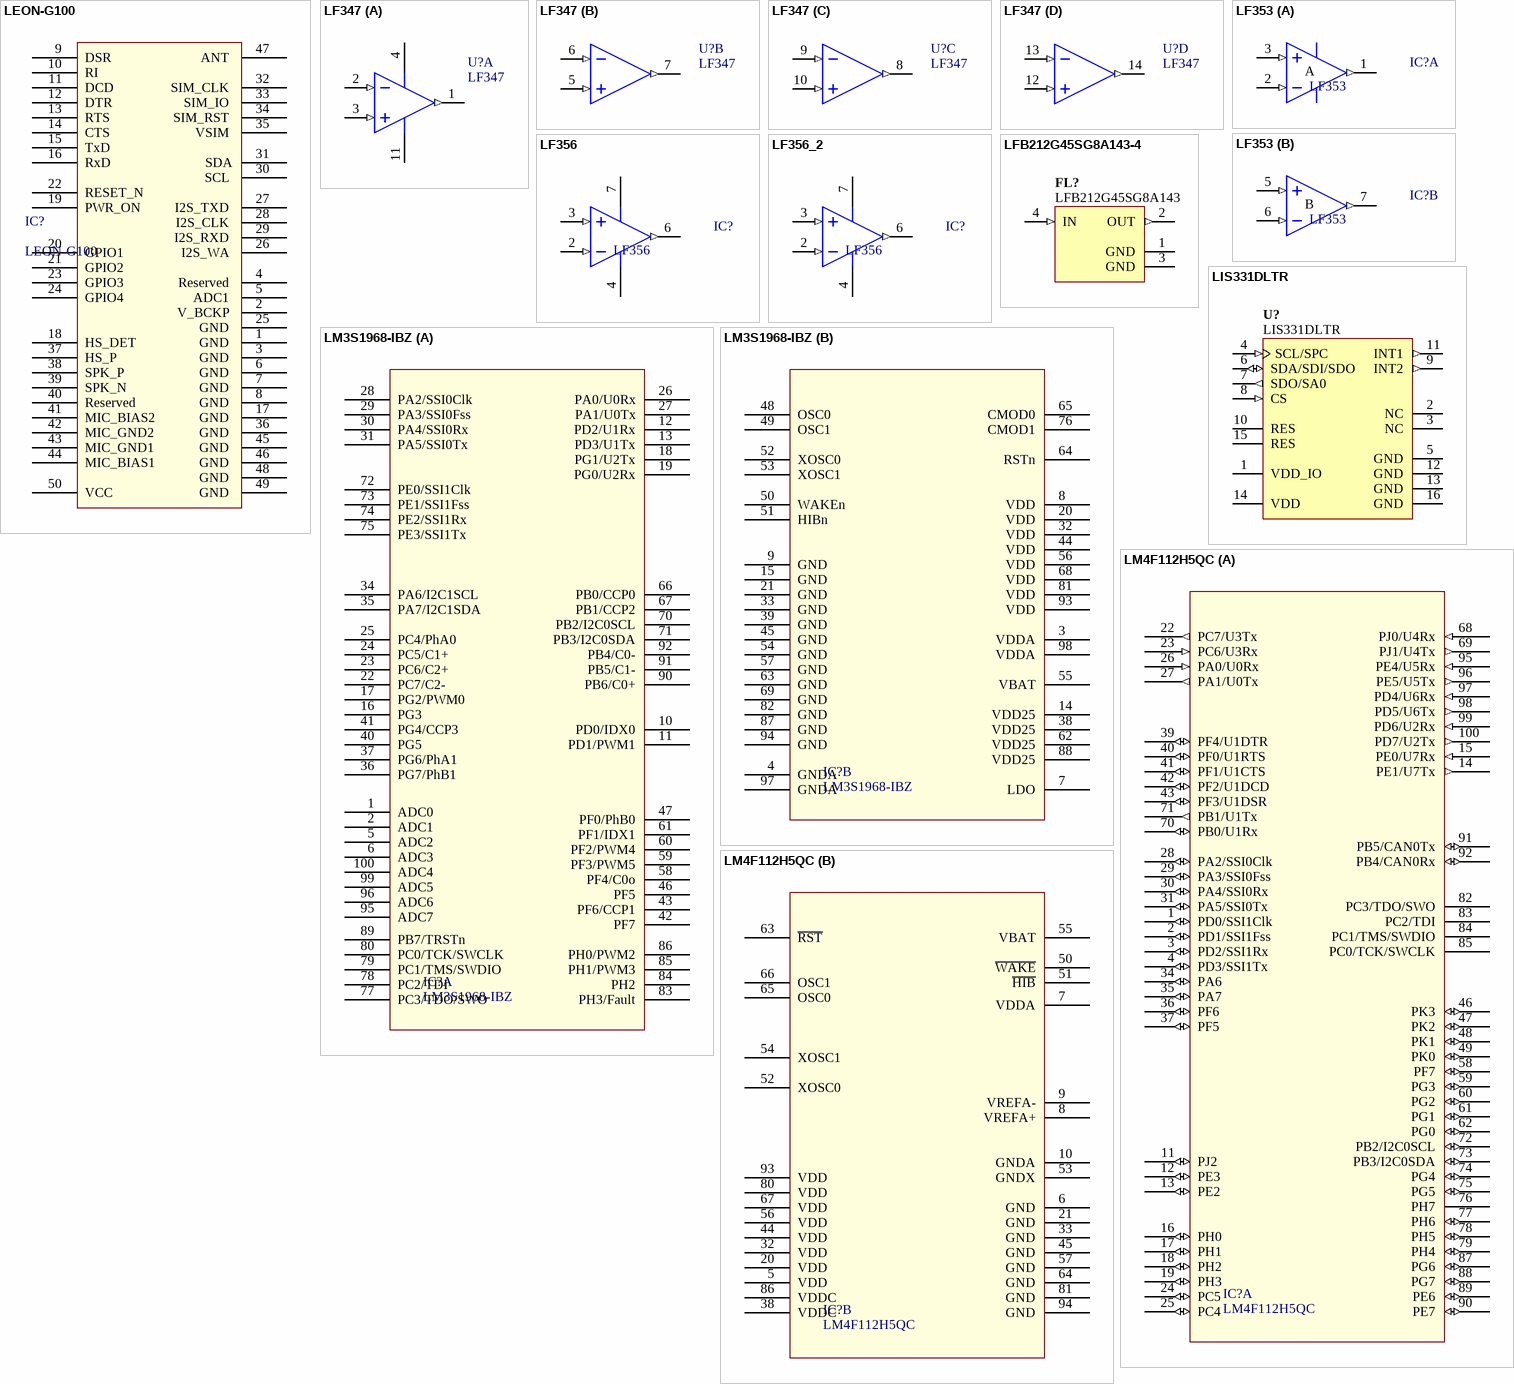
[diagram p50: symbols LEON-G100 to LM4F112H5QC]

## LEON-G100
designator IC?
LEON-G100 quad-band GSM/GPRS
footprint LEON-G100 (LCC, 50-Pins, Body 19,0x30,1mm (max), Pitch 1,10mm, IPC Medium Density)
pins: 1 GND , 2 V_BCKP , 3 GND , 4 Reserved , 5 ADC1 , 6 GND , 7 GND , 8 GND , 9 DSR , 10 RI , 11 DCD , 12 DTR , 13 RTS , 14 CTS , 15 TxD , 16 RxD, 17 GND , 18 HS_DET, 19 PWR_ON , 20 GPIO1 , 21 GPIO2 , 22 RESET_N , 23 GPIO3 , 24 GPIO4 , 25 GND , 26 I2S_WA , 27 I2S_TXD , 28 I2S_CLK , 29 I2S_RXD , 30 SCL , 31 SDA, 32 SIM_CLK , 33 SIM_IO , 34 SIM_RST , 35 VSIM , 36 GND , 37 HS_P , 38 SPK_P , 39 SPK_N , 40 Reserved , 41 MIC_BIAS2 , 42 MIC_GND2 , 43 MIC_GND1, 44 MIC_BIAS1 , 45 GND , 46 GND , 47 ANT , 48 GND , 49 GND , 50 VCC 

## LF347
designator U?
Low Power Quad Operational Amplifier; Manufacturer Part Number: LF347BD; Manufacturer: Texas Instruments; Text Field1: pristel=Nsc\nsanopea\<parttype>.ckt; Slew Rate: 13 V/µs; Voltage - Supply, Single/Dual (±): 7 V ~ 36 V, ±3.5 V ~ 18 V; Current - Input Bias: 50pA; Voltage - Input Offset: 3000µV; Number of Circuits: 4; Gain Bandwidth Product: 3MHz; Amplifier Type: J-FET; Current - Supply: 8mA; Supplier 1: Digi-Key; Supplier Part Number 1: 296-7136-5-ND; Package / Case: 14-SOIC (3.9mm Width), 14-SOL; Supplier: Digi-Key; Current - Output / Channel: -; Packaging: Tube; RoHS: RoHS Compliant; Output Type: -; Operating Temperature: 0°C ~ 70°C; Category: Integrated Circuits (ICs); Supplier Part Number: 296-7136-5-ND
footprint SO14
footprint DIP14
part A pins: 1 1 OUT (out), 2 1 IN- (in), 3 1 IN+ (in), 4 VCC (power), 11 VEE (power)
part B pins: 5 2 IN+ (in), 6 2 IN- (in), 7 2 OUT (out)
part C pins: 8 3 OUT (out), 9 3 IN- (in), 10 3 IN+ (in)
part D pins: 12 4 IN+ (in), 13 4 IN- (in), 14 4 OUT (out)

## LF353
designator IC?
Wide-Bandwidth Dual JFET Input Operational Amplifier; Published: 15-Apr-2002; LatestRevisionDate: 06-Jun-2005; LatestRevisionNote: Stylized 3D Model Added.; DatasheetDocument: Apr-1998; PackageDocument: Sep-1997; Publisher: Altium Limited; ComponentLink1Description: Manufacturer Link; ComponentLink1URL: http://www.national.com/; ComponentLink2Description: Datasheet; ComponentLink2URL: http://www.national.com/ds.cgi/LF/LF353.pdf; ComponentLink3Description: URL Link1; ComponentLink3URL: http://www.national.com/pf/LF/LF353.html; Value: LF353
footprint DIP8/W0.3 (8 PIN, W 300mil, Pin to pin 100mil)
part A pins: 1 OUT (out), 2 IN- (in), 3 IN+ (in)
part B pins: 5 IN+ (in), 6 IN- (in), 7 OUT (out)
part A text: A
part B text: B

## LF356
designator IC?
Wide-Bandwidth Single JFET Input Operational Amplifier; Published: 15-Apr-2002; LatestRevisionDate: 06-Jun-2005; LatestRevisionNote: Stylized 3D Model Added.; DatasheetDocument: Apr-1998; PackageDocument: Sep-1997; Publisher: Altium Limited; ComponentLink1Description: Manufacturer Link; ComponentLink1URL: http://www.national.com/; ComponentLink2Description: Datasheet; ComponentLink2URL: http://www.national.com/ds.cgi/LF/LF353.pdf; ComponentLink3Description: URL Link1; ComponentLink3URL: http://www.national.com/pf/LF/LF353.html; Value: LF356
footprint DIP8/W0.3 (8 PIN, W 300mil, Pin to pin 100mil)
pins: 2 IN- (in), 3 IN+ (in), 4 V- (power), 6 OUT (out), 7 V+ (power)

## LF356_2
designator IC?, comment LF356
Wide-Bandwidth Single JFET Input Operational Amplifier; Published: 15-Apr-2002; LatestRevisionDate: 06-Jun-2005; LatestRevisionNote: Stylized 3D Model Added.; DatasheetDocument: Apr-1998; PackageDocument: Sep-1997; Publisher: Altium Limited; ComponentLink1Description: Manufacturer Link; ComponentLink1URL: http://www.national.com/; ComponentLink2Description: Datasheet; ComponentLink2URL: http://www.national.com/ds.cgi/LF/LF353.pdf; ComponentLink3Description: URL Link1; ComponentLink3URL: http://www.national.com/pf/LF/LF353.html; Value: LF356
footprint DIP8/W0.3 (8 PIN, W 300mil, Pin to pin 100mil)
pins: 2 IN- (in), 3 IN+ (in), 4 V- (power), 6 OUT (out), 7 V+ (power)

## LFB212G45SG8A143-4
designator FL?, comment LFB212G45SG8A143
LFB21(0805)_SG Series Filter for Wireless LAN/Bluetooth, 2400-2500 MHz, 2 x 1.25 x 0.95 mm; Manufacturer: Murata; Attenuation (Absolute Value) II) (dB): 30 min. at 1710~1990MHz; Nominal Center Frequency (fo): 2450 MHz; Attenuation (Absolute Value) I) (dB): 20 min. at 880-1710 MHz; Insertion Loss in BW (dB) max: 2.7; Packing: Tape and Reel; Bandwidth (BW): 2450 +/-50MHz; ComponentLink1Description: Manufacturer URL; DatasheetVersion: Dec-10; ComponentLink3Description: Package Specification; ComponentLink1URL: http://www.murata.com/; PartNumber: LFB212G45SG8A143; Mounting Technology: Surface Mount; PackageDescription: 4-Pin Hand drawn, Body 2x1.25mm; ComponentLink2Description: Datasheet; PackageReference: LFB212G45SG8A143-4; ComponentLink2URL: http://www.murata.com/products/catalog/pdf/k99/k99e_l0270.pdf; ComponentLink3URL: http://search.murata.co.jp/Ceramy/CatalogAction.do?sHinnm=?%C2%A0&sNHinnm=LFB212G45SG8A143&sNhin_key=LFB212G45SG8A143&sLang=en&sParam=LFB21
footprint MUR-LFB212G45SG8A143-4 (Hand Drawn, 4-Leads, Body 2x1.25mm)
pins: 1 GND (power), 2 OUT (out), 3 GND (power), 4 IN (in)

## LIS331DLTR
designator U?
MEMS motion sensor 3-axis - ± 2g/± 8g smart digital output nano accelerometer, -40 to +85°C, LGA-16 (3x3x1), Tape and Reel; Manufacturer: STMicroelectronics; ComponentLink3URL: http://www.st.com/internet/analog/product/191236.jsp; PackageVersion: 2008; ComponentLink2Description: LIS331DL Datasheet; ComponentLink1Description: Manufacturer URL; ComponentLink2URL: http://www.st.com/internet/com/TECHNICAL_RESOURCES/TECHNICAL_LITERATURE/DATASHEET/CD00172345.pdf; RevisionNote: PCB layout corrected.; PackageDescription: 16-Pin Land Grid Array, 3 x 3 x 1 mm Body, 0.5 mm Pitch; DatasheetVersion: rev3, Apr-2008; ComponentLink3Description: LIS331DL Web Page; PackageReference: LGA16-3X3X1; ComponentLink1URL: http://www.st.com/
footprint QFN16 (PQFN, 16-Leads, Body 3x3mm, Pitch 0.5mm, IPC High Density)
pins: 1 VDD_IO (power), 2 NC, 3 NC, 4 SCL/SPC (in), 5 GND (power), 6 SDA/SDI/SDO (io), 7 SDO/SA0 (out), 8 CS (in), 9 INT2 (out), 10 RES, 11 INT1 (out), 12 GND (power), 13 GND (power), 14 VDD (power), 15 RES, 16 GND (power)

## LM3S1968-IBZ
designator IC?
Stellaris ARM Cortex-M3 Microcontroller; Value: LM324
part A pins: 1 ADC0, 2 ADC1, 5 ADC2, 6 ADC3, 10 PD0/IDX0, 11 PD1/PWM1, 12 PD2/U1Rx, 13 PD3/U1Tx, 16 PG3, 17 PG2/PWM0, 18 PG1/U2Tx, 19 PG0/U2Rx, 22 PC7/C2-, 23 PC6/C2+, 24 PC5/C1+, 25 PC4/PhA0, 26 PA0/U0Rx, 27 PA1/U0Tx, 28 PA2/SSI0Clk, 29 PA3/SSI0Fss, 30 PA4/SSI0Rx, 31 PA5/SSI0Tx, 34 PA6/I2C1SCL, 35 PA7/I2C1SDA, 36 PG7/PhB1, 37 PG6/PhA1, 40 PG5, 41 PG4/CCP3, 42 PF7, 43 PF6/CCP1, 46 PF5, 47 PF0/PhB0, 58 PF4/C0o, 59 PF3/PWM5, 60 PF2/PWM4, 61 PF1/IDX1, 66 PB0/CCP0, 67 PB1/CCP2, 70 PB2/I2C0SCL, 71 PB3/I2C0SDA, 72 PE0/SSI1Clk, 73 PE1/SSI1Fss, 74 PE2/SSI1Rx, 75 PE3/SSI1Tx, 77 PC3/TDO/SWO, 78 PC2/TDI, 79 PC1/TMS/SWDIO, 80 PC0/TCK/SWCLK, 83 PH3/Fault, 84 PH2, 85 PH1/PWM3, 86 PH0/PWM2, 89 PB7/TRSTn, 90 PB6/C0+, 91 PB5/C1-, 92 PB4/C0-, 95 ADC7, 96 ADC6, 99 ADC5, 100 ADC4
part B pins: 3 VDDA, 4 GNDA, 7 LDO, 8 VDD, 9 GND, 14 VDD25, 15 GND, 20 VDD, 21 GND, 32 VDD, 33 GND, 38 VDD25, 39 GND, 44 VDD, 45 GND, 48 OSC0, 49 OSC1, 50 WAKEn, 51 HIBn, 52 XOSC0, 53 XOSC1, 54 GND, 55 VBAT, 56 VDD, 57 GND, 62 VDD25, 63 GND, 64 RSTn, 65 CMOD0, 68 VDD, 69 GND, 76 CMOD1, 81 VDD, 82 GND, 87 GND, 88 VDD25, 93 VDD, 94 GND, 97 GNDA, 98 VDDA

## LM4F112H5QC
designator IC?
Stellaris  ® LM4F112H5QC Microcontroller; Value: LM324
part A pins: 1 PD0/SSI1Clk (io), 2 PD1/SSI1Fss (io), 3 PD2/SSI1Rx (io), 4 PD3/SSI1Tx (io), 11 PJ2 (io), 12 PE3 (io), 13 PE2 (io), 14 PE1/U7Tx (out), 15 PE0/U7Rx (in), 16 PH0 (io), 17 PH1 (io), 18 PH2 (io), 19 PH3 (io), 22 PC7/U3Tx (out), 23 PC6/U3Rx (in), 24 PC5 (io), 25 PC4 (io), 26 PA0/U0Rx (in), 27 PA1/U0Tx (out), 28 PA2/SSI0Clk (io), 29 PA3/SSI0Fss (io), 30 PA4/SSI0Rx (io), 31 PA5/SSI0Tx (io), 34 PA6 (io), 35 PA7 (io), 36 PF6 (io), 37 PF5 (io), 39 PF4/U1DTR (io), 40 PF0/U1RTS (io), 41 PF1/U1CTS (io), 42 PF2/U1DCD (io), 43 PF3/U1DSR (io), 46 PK3 (io), 47 PK2 (io), 48 PK1 (io), 49 PK0 (io), 58 PF7 (io), 59 PG3 (io), 60 PG2 (io), 61 PG1 (io), 62 PG0 (io), 68 PJ0/U4Rx (in), 69 PJ1/U4Tx (out), 70 PB0/U1Rx (io), 71 PB1/U1Tx (out), 72 PB2/I2C0SCL (io), 73 PB3/I2C0SDA (io), 74 PG4 (io), 75 PG5 (io), 76 PH7, 77 PH6 (io), 78 PH5 (io), 79 PH4 (io), 82 PC3/TDO/SWO, 83 PC2/TDI, 84 PC1/TMS/SWDIO, 85 PC0/TCK/SWCLK, 87 PG6 (io), 88 PG7 (io), 89 PE6 (io), 90 PE7 (io), 91 PB5/CAN0Tx (io), 92 PB4/CAN0Rx (io), 95 PE4/U5Rx (in), 96 PE5/U5Tx (out), 97 PD4/U6Rx (in), 98 PD5/U6Tx (out), 99 PD6/U2Rx (in), 100 PD7/U2Tx (out)
part B pins: 5 VDD (power), 6 GND (power), 7 VDDA (power), 8 VREFA+ (power), 9 VREFA- (power), 10 GNDA (power), 20 VDD (power), 21 GND (power), 32 VDD (power), 33 GND (power), 38 VDDC (power), 44 VDD (power), 45 GND (power), 50 ~{WAKE}, 51 ~{HIB}, 52 XOSC0, 53 GNDX (power), 54 XOSC1, 55 VBAT (power), 56 VDD (power), 57 GND (power), 63 ~{RST}, 64 GND (power), 65 OSC0, 66 OSC1, 67 VDD (power), 80 VDD (power), 81 GND (power), 86 VDDC (power), 93 VDD (power), 94 GND (power)
